# Altium footprint library pcb_ConnectorGeneral.PcbLib: 111 footprints (part 4 of 7)
Each footprint in its own frame and in the unit in brackets; x right, y up, seen from the top. Pads: shape width x height; smd on the part's side, far side on the other; paste and mask are expansions set on the pad; w line width, h text height; cw(c..) or ccw(c..) is an arc to the next point about the centre after c.
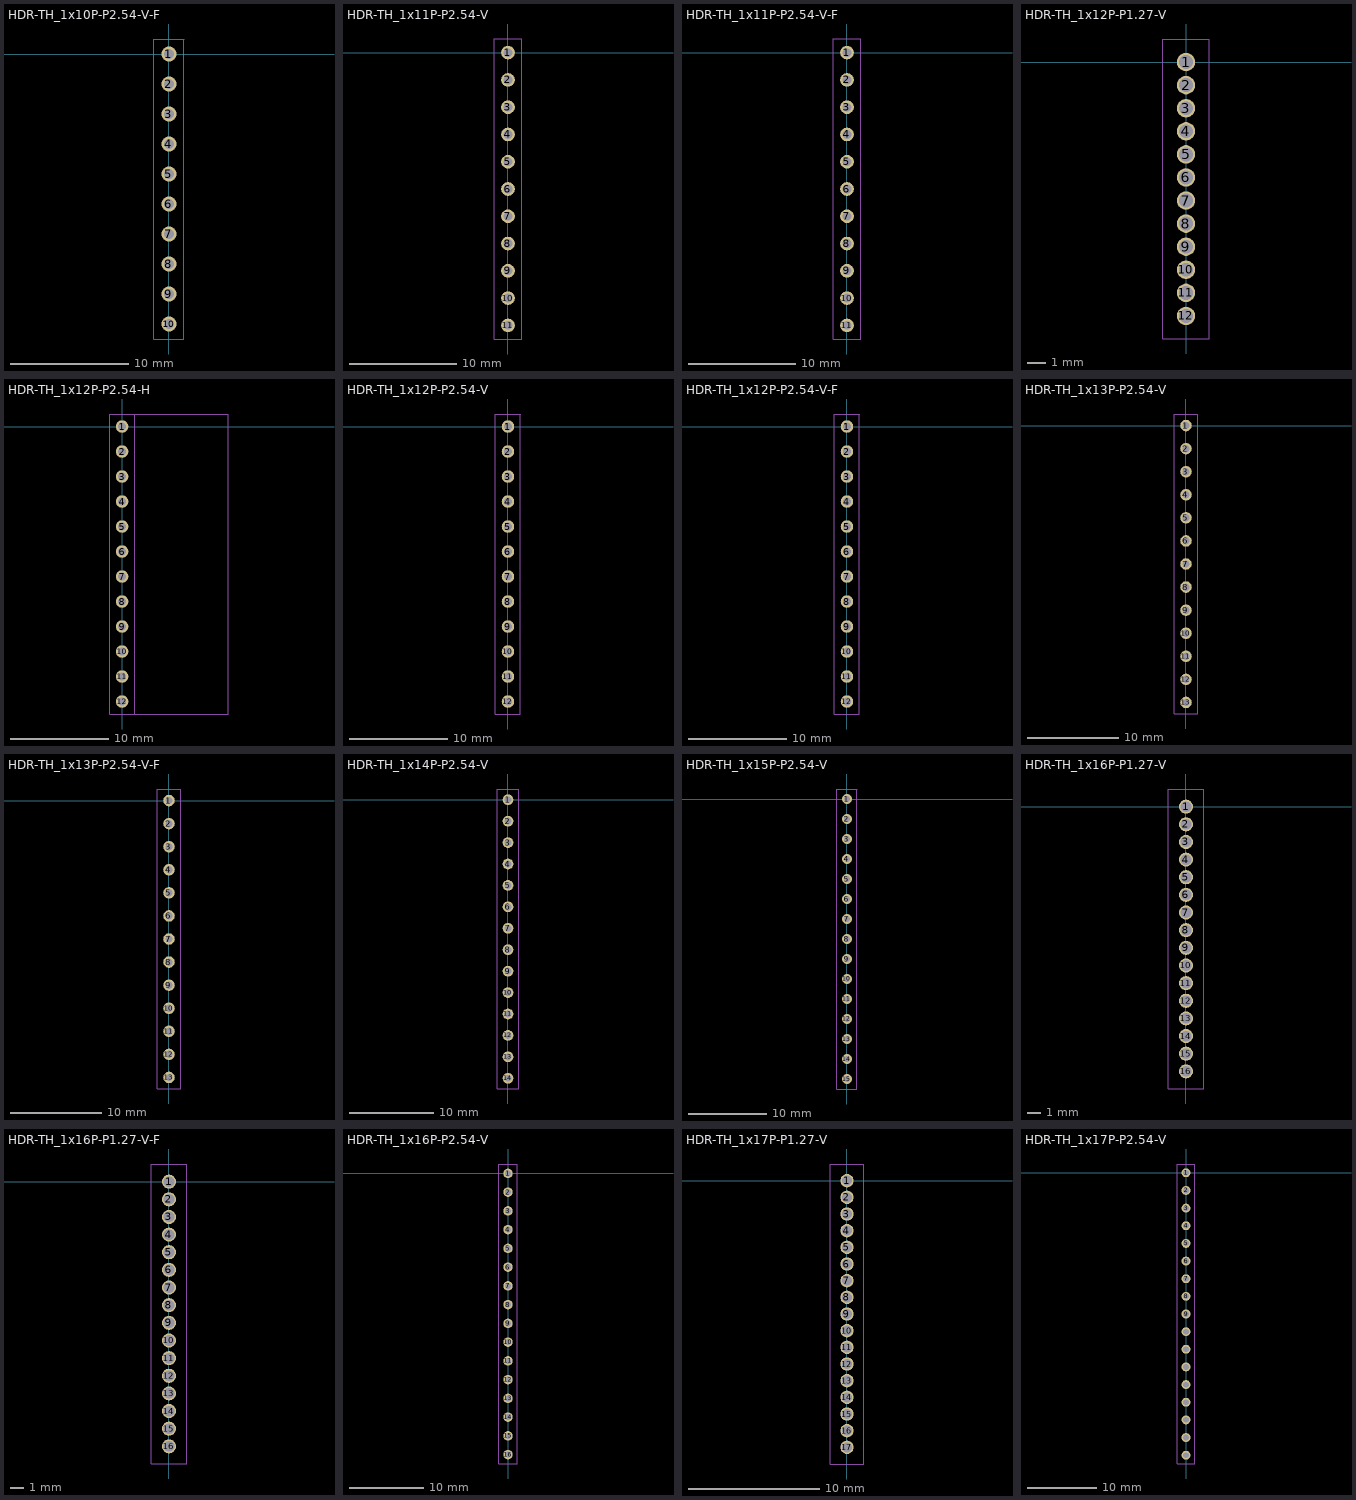
[diagram p3: the footprints below, top view; thin cyan lines are the x and y axes]

## HDR-TH_1x10P-P2.54-V-F [mil]
height 169.29
pads (10):
  round 50 hole 32: 1(0,0) 2(0,-100) 3(0,-200) 4(0,-300) 5(0,-400) 6(0,-500) 7(0,-600) 8(0,-700) 9(0,-800) 10(0,-900)
Mechanical 13:
  lines w2: -50,-950 -50,50 50,50 50,-950 -50,-950
Mechanical 14:
  lines w2: -50,-950 50,-950 50,50 -50,50 -50,-950
Mechanical 16:
  text ".Designator" at 0,0 h39.37
3D body "female_header_a-bl254-eg-g10d.stp": height 334.65, standoff -125.98, extent -49.21,-954.92 49.22,54.92

## HDR-TH_1x11P-P2.54-V [mil]
height 169.29
pads (11):
  round 50 hole 32: 1(0,0) 2(0,-100) 3(0,-200) 4(0,-300) 5(0,-400) 6(0,-500) 7(0,-600) 8(0,-700) 9(0,-800) 10(0,-900) 11(0,-1000)
Mechanical 13:
  lines w2: -50,-1050 -50,50 50,50 50,-1050 -50,-1050
Mechanical 14:
  lines w2: -50,-1050 -50,50 50,50 50,-1050 -50,-1050
Mechanical 16:
  text ".Designator" at 0,0 h39.37
3D body "pin_header_aw140-eg-g11d.stp": height 322.83, standoff -118.11, extent -49.18,-1049.99 49.18,50

## HDR-TH_1x11P-P2.54-V-F [mil]
height 169.29
pads (11):
  round 50 hole 32: 1(0,0) 2(0,-100) 3(0,-200) 4(0,-300) 5(0,-400) 6(0,-500) 7(0,-600) 8(0,-700) 9(0,-800) 10(0,-900) 11(0,-1000)
Mechanical 13:
  lines w2: -50,-1050 50,-1050 50,50 -50,50 -50,-1050
Mechanical 14:
  lines w2: -50,-1050 50,-1050 50,50 -50,50 -50,-1050
Mechanical 16:
  text ".Designator" at 0,0 h39.37
3D body "female_header_a-bl254-eg-g11d.stp": height 334.65, standoff -125.98, extent -49.21,-1054.92 49.22,54.93

## HDR-TH_1x12P-P1.27-V [mil]
height 169.29
pads (12):
  round 40 hole 30: 1(0,0) 2(0,-50) 3(0,-100) 4(0,-150) 5(0,-200) 6(0,-250) 7(0,-300) 8(0,-350) 9(0,-400) 10(0,-450) 11(0,-500) 12(0,-550)
Mechanical 13:
  lines w2: -50,-600 50,-600 50,50 -50,50 -50,-600
Mechanical 14:
  lines w2: -50,-600 50,-600 50,50 -50,50 -50,-600
Mechanical 16:
  text ".Designator" at 0,0 h39.37
3D body "pin_header_a-sl127-eg-g12d.stp": height 210.24, standoff -102.36, extent -49.21,-575 49.22,25

## HDR-TH_1x12P-P2.54-H [mil]
height 169.29
pads (12):
  round 50 hole 32: 1(0,0) 2(0,-100) 3(0,-200) 4(0,-300) 5(0,-400) 6(0,-500) 7(0,-600) 8(0,-700) 9(0,-800) 10(0,-900) 11(0,-1000) 12(0,-1100)
Mechanical 13:
  lines w2: -50,-1150 425,-1150 425,50 -50,50 -50,-1150
Mechanical 14:
  lines w2: -50,-1150 50,-1150 50,50 -50,50 -50,-1150
Mechanical 16:
  text ".Designator" at 0,0 h39.37
3D body "pin_header_aw140-ea-g12g.stp": height 99.21, standoff -93.7, extent -15,-1146.06 423.58,46.07

## HDR-TH_1x12P-P2.54-V [mil]
height 169.29
pads (12):
  round 50 hole 32: 1(0,0) 2(0,-100) 3(0,-200) 4(0,-300) 5(0,-400) 6(0,-500) 7(0,-600) 8(0,-700) 9(0,-800) 10(0,-900) 11(0,-1000) 12(0,-1100)
Mechanical 13:
  lines w2: -50,-1150 50,-1150 50,50 -50,50 -50,-1150
Mechanical 14:
  lines w2: -50,-1150 50,-1150 50,50 -50,50 -50,-1150
Mechanical 16:
  text ".Designator" at 0,0 h39.37
3D body "pin_header_aw140-eg-g12d.stp": height 322.83, standoff -118.11, extent -49.19,-1149.99 49.18,50

## HDR-TH_1x12P-P2.54-V-F [mil]
height 169.29
pads (12):
  round 50 hole 32: 1(0,0) 2(0,-100) 3(0,-200) 4(0,-300) 5(0,-400) 6(0,-500) 7(0,-600) 8(0,-700) 9(0,-800) 10(0,-900) 11(0,-1000) 12(0,-1100)
Mechanical 13:
  lines w2: -50,-1150 50,-1150 50,50 -50,50 -50,-1150
Mechanical 14:
  lines w2: -50,-1150 50,-1150 50,50 -50,50 -50,-1150
Mechanical 16:
  text ".Designator" at 0,0 h39.37
3D body "female_header_a-bl254-eg-g12d.stp": height 334.65, standoff -125.98, extent -49.22,-1154.92 49.21,54.92

## HDR-TH_1x13P-P2.54-V [mil]
height 169.29
pads (13):
  round 50 hole 32: 1(0,0) 2(0,-100) 3(0,-200) 4(0,-300) 5(0,-400) 6(0,-500) 7(0,-600) 8(0,-700) 9(0,-800) 10(0,-900) 11(0,-1000) 12(0,-1100) 13(0,-1200)
Mechanical 13:
  lines w2: -50,-1250 -50,50 50,50 50,-1250 -50,-1250
Mechanical 14:
  lines w2: -50,-1250 50,-1250 50,50 -50,50 -50,-1250
Mechanical 16:
  text ".Designator" at 0,0 h39.37
3D body "pin_header_aw140-eg-g13d.stp": height 322.83, standoff -118.11, extent -49.19,-1250 49.18,50

## HDR-TH_1x13P-P2.54-V-F [mil]
height 169.29
pads (13):
  round 50 hole 32: 1(0,0) 2(0,-100) 3(0,-200) 4(0,-300) 5(0,-400) 6(0,-500) 7(0,-600) 8(0,-700) 9(0,-800) 10(0,-900) 11(0,-1000) 12(0,-1100) 13(0,-1200)
Mechanical 13:
  lines w2: -50,-1250 50,-1250 50,50 -50,50 -50,-1250
Mechanical 14:
  lines w2: -50,-1250 -50,50 50,50 50,-1250 -50,-1250
Mechanical 16:
  text ".Designator" at 0,0 h39.37
3D body "female_header_a-bl254-eg-g13d.stp": height 334.65, standoff -125.98, extent -49.21,-1254.92 49.22,54.93

## HDR-TH_1x14P-P2.54-V [mil]
height 169.29
pads (14):
  round 50 hole 32: 1(0,0) 2(0,-100) 3(0,-200) 4(0,-300) 5(0,-400) 6(0,-500) 7(0,-600) 8(0,-700) 9(0,-800) 10(0,-900) 11(0,-1000) 12(0,-1100) 13(0,-1200) 14(0,-1300)
Mechanical 13:
  lines w2: -50,-1350 -50,50 50,50 50,-1350 -50,-1350
Mechanical 14:
  lines w2: -50,-1350 -50,50 50,50 50,-1350 -50,-1350
Mechanical 16:
  text ".Designator" at 0,0 h39.37
3D body "pin_header_aw140-eg-g14d.stp": height 322.83, standoff -118.11, extent -49.18,-1350 49.18,50

## HDR-TH_1x15P-P2.54-V [mil]
height 169.29
pads (15):
  round 50 hole 32: 1(0,0) 2(0,-100) 3(0,-200) 4(0,-300) 5(0,-400) 6(0,-500) 7(0,-600) 8(0,-700) 9(0,-800) 10(0,-900) 11(0,-1000) 12(0,-1100) 13(0,-1200) 14(0,-1300) 15(0,-1400)
Mechanical 13:
  lines w2: -50,-1450 50,-1450 50,50 -50,50 -50,-1450
Mechanical 14:
  lines w2: -50,-1450 -50,50 50,50 50,-1450 -50,-1450
Mechanical 16:
  text ".Designator" at 0,0 h39.37
3D body "pin_header_aw140-eg-g15d.stp": height 322.83, standoff -118.11, extent -49.18,-1450 49.18,50

## HDR-TH_1x16P-P1.27-V [mil]
height 169.29
pads (16):
  round 40 hole 30: 1(0,0) 2(0,-50) 3(0,-100) 4(0,-150) 5(0,-200) 6(0,-250) 7(0,-300) 8(0,-350) 9(0,-400) 10(0,-450) 11(0,-500) 12(0,-550) 13(0,-600) 14(0,-650) 15(0,-700) 16(0,-750)
Mechanical 13:
  lines w2: -50,-800 -50,50 50,50 50,-800 -50,-800
Mechanical 14:
  lines w2: -50,-800 -50,50 50,50 50,-800 -50,-800
Mechanical 16:
  text ".Designator" at 0,0 h39.37
3D body "pin_header_a-sl127-eg-g16d.stp": height 210.24, standoff -102.36, extent -49.21,-775 49.22,25

## HDR-TH_1x16P-P1.27-V-F [mil]
height 169.29
pads (16):
  round 40 hole 30: 1(0,0) 2(0,-50) 3(0,-100) 4(0,-150) 5(0,-200) 6(0,-250) 7(0,-300) 8(0,-350) 9(0,-400) 10(0,-450) 11(0,-500) 12(0,-550) 13(0,-600) 14(0,-650) 15(0,-700) 16(0,-750)
Mechanical 13:
  lines w2: -50,-800 50,-800 50,50 -50,50 -50,-800
Mechanical 14:
  lines w2: -50,-800 50,-800 50,50 -50,50 -50,-800
Mechanical 16:
  text ".Designator" at 0,0 h39.37
3D body "female_header_a-bl127-eg-g16d.stp": height 133.86, standoff -94.49, extent -35.43,-782.87 35.44,32.88

## HDR-TH_1x16P-P2.54-V [mil]
height 169.29
pads (16):
  round 50 hole 32: 1(0,0) 2(0,-100) 3(0,-200) 4(0,-300) 5(0,-400) 6(0,-500) 7(0,-600) 8(0,-700) 9(0,-800) 10(0,-900) 11(0,-1000) 12(0,-1100) 13(0,-1200) 14(0,-1300) 15(0,-1400) 16(0,-1500)
Mechanical 13:
  lines w2: -50,-1550 50,-1550 50,50 -50,50 -50,-1550
Mechanical 14:
  lines w2: -50,-1550 50,-1550 50,50 -50,50 -50,-1550
Mechanical 16:
  text ".Designator" at 0,0 h39.37
3D body "pin_header_aw140-eg-g16d.stp": height 322.83, standoff -118.11, extent -49.18,-1550 49.18,50

## HDR-TH_1x17P-P1.27-V [mil]
height 169.29
pads (17):
  round 40 hole 30: 1(0,0) 2(0,-50) 3(0,-100) 4(0,-150) 5(0,-200) 6(0,-250) 7(0,-300) 8(0,-350) 9(0,-400) 10(0,-450) 11(0,-500) 12(0,-550) 13(0,-600) 14(0,-650) 15(0,-700) 16(0,-750) 17(0,-800)
Mechanical 13:
  lines w2: -50,-850 -50,50 50,50 50,-850 -50,-850
Mechanical 14:
  lines w2: -50,-850 50,-850 50,50 -50,50 -50,-850
Mechanical 16:
  text ".Designator" at 0,0 h39.37
3D body "pin_header_a-sl127-eg-g17d.stp": height 210.24, standoff -102.36, extent -49.21,-824.99 49.21,25.01

## HDR-TH_1x17P-P2.54-V [mil]
height 169.29
pads (17):
  round 50 hole 32: 1(0,0) 2(0,-100) 3(0,-200) 4(0,-300) 5(0,-400) 6(0,-500) 7(0,-600) 8(0,-700) 9(0,-800) 10(0,-900) 11(0,-1000) 12(0,-1100) 13(0,-1200) 14(0,-1300) 15(0,-1400) 16(0,-1500) 17(0,-1600)
Mechanical 13:
  lines w2: -50,-1650 -50,50 50,50 50,-1650 -50,-1650
Mechanical 14:
  lines w2: -50,-1650 -50,50 50,50 50,-1650 -50,-1650
Mechanical 16:
  text ".Designator" at 0,0 h39.37
3D body "pin_header_aw140-eg-g17d.stp": height 322.83, standoff -118.11, extent -49.19,-1649.99 49.18,50.01